# Altium footprint library Header.PcbLib: 297 footprints (part 3 of 23)
Each footprint in its own frame and in the unit in brackets; x right, y up, seen from the top. Pads: shape width x height; smd on the part's side, far side on the other; paste and mask are expansions set on the pad; w line width, h text height; cw(c..) or ccw(c..) is an arc to the next point about the centre after c.
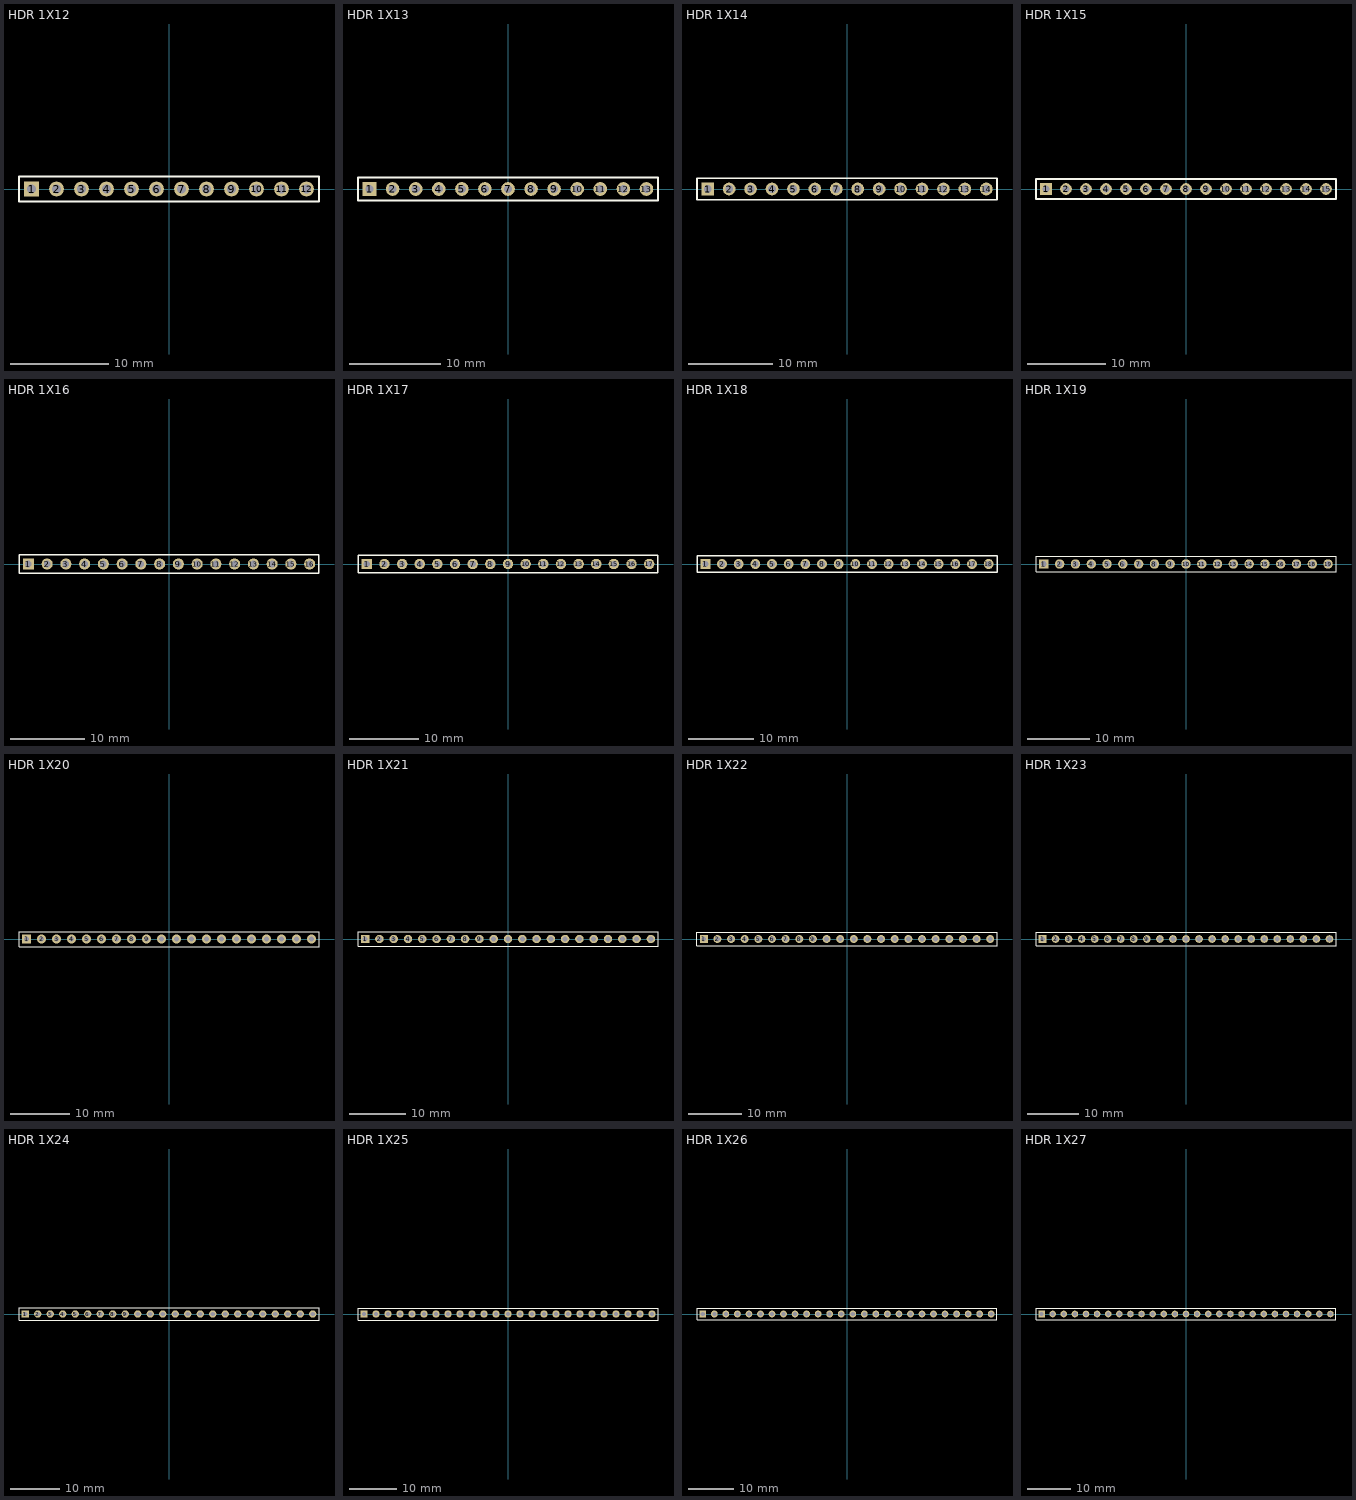
[diagram p2: the footprints below, top view; thin cyan lines are the x and y axes]

## HDR 1X12 [mm] "Connector; Header; 12 Position"
height 1.75
pads (12):
  rect 1.5x1.5 hole 0.9: 1(-13.97,0)
  round 1.5 hole 0.9: 2(-11.43,0) 3(-8.89,0) 4(-6.35,0) 5(-3.81,0) 6(-1.27,0) 7(1.27,0) 8(3.81,0) 9(6.35,0) 10(8.89,0) 11(11.43,0) 12(13.97,0)
Top Overlay:
  lines w0.2: -15.24,-1.27 15.24,-1.27 15.24,1.27 -15.24,1.27 -15.24,-1.27
3D body "header 12.STEP": height 8.51, standoff -3.68, extent -15.23,-1.27 15.24,1.26

## HDR 1X13 [mm] "Connector; Header; 13 Position"
height 1.75
pads (13):
  rect 1.5x1.5 hole 0.9: 1(-15.24,0)
  round 1.5 hole 0.9: 2(-12.7,0) 3(-10.16,0) 4(-7.62,0) 5(-5.08,0) 6(-2.54,0) 7(0,0) 8(2.54,0) 9(5.08,0) 10(7.62,0) 11(10.16,0) 12(12.7,0) 13(15.24,0)
Top Overlay:
  lines w0.2: -16.51,-1.27 16.51,-1.27 16.51,1.27 -16.51,1.27 -16.51,-1.27
3D body "header 13.STEP": height 8.51, standoff -3.68, extent -16.5,-1.27 16.51,1.26

## HDR 1X14 [mm] "Connector; Header; 14 Position"
height 1.75
pads (14):
  rect 1.5x1.5 hole 0.9: 1(-16.51,0)
  round 1.5 hole 0.9: 2(-13.97,0) 3(-11.43,0) 4(-8.89,0) 5(-6.35,0) 6(-3.81,0) 7(-1.27,0) 8(1.27,0) 9(3.81,0) 10(6.35,0) 11(8.89,0) 12(11.43,0) 13(13.97,0) 14(16.51,0)
Top Overlay:
  lines w0.2: -17.78,-1.27 17.78,-1.27 17.78,1.27 -17.78,1.27 -17.78,-1.27
3D body "header 14.STEP": height 8.51, standoff -3.68, extent -17.77,-1.27 17.78,1.26

## HDR 1X15 [mm] "Connector; Header; 15 Position"
height 1.75
pads (15):
  rect 1.5x1.5 hole 0.9: 1(-17.78,0)
  round 1.5 hole 0.9: 2(-15.24,0) 3(-12.7,0) 4(-10.16,0) 5(-7.62,0) 6(-5.08,0) 7(-2.54,0) 8(0,0) 9(2.54,0) 10(5.08,0) 11(7.62,0) 12(10.16,0) 13(12.7,0) 14(15.24,0) 15(17.78,0)
Top Overlay:
  lines w0.2: -19.05,-1.27 -19.05,1.27 19.05,1.27 19.05,-1.27 -19.05,-1.27
3D body "header 15.STEP": height 8.51, standoff -3.68, extent -19.04,-1.27 19.05,1.26

## HDR 1X16 [mm] "Connector; Header; 16 Position"
height 1.75
pads (16):
  rect 1.5x1.5 hole 0.9: 1(-19.05,0)
  round 1.5 hole 0.9: 2(-16.51,0) 3(-13.97,0) 4(-11.43,0) 5(-8.89,0) 6(-6.35,0) 7(-3.81,0) 8(-1.27,0) 9(1.27,0) 10(3.81,0) 11(6.35,0) 12(8.89,0) 13(11.43,0) 14(13.97,0) 15(16.51,0) 16(19.05,0)
Top Overlay:
  lines w0.2: -20.32,-1.27 -20.32,1.27 20.32,1.27 20.32,-1.27 -20.32,-1.27
3D body "header 16.STEP": height 8.51, standoff -3.68, extent -20.31,-1.27 20.32,1.26

## HDR 1X17 [mm] "Connector; Header; 17 Position"
height 1.75
pads (17):
  rect 1.5x1.5 hole 0.9: 1(-20.32,0)
  round 1.5 hole 0.9: 2(-17.78,0) 3(-15.24,0) 4(-12.7,0) 5(-10.16,0) 6(-7.62,0) 7(-5.08,0) 8(-2.54,0) 9(0,0) 10(2.54,0) 11(5.08,0) 12(7.62,0) 13(10.16,0) 14(12.7,0) 15(15.24,0) 16(17.78,0) 17(20.32,0)
Top Overlay:
  lines w0.2: -21.59,-1.27 -21.59,1.27 21.59,1.27 21.59,-1.27 -21.59,-1.27
3D body "header 17.STEP": height 8.51, standoff -3.68, extent -21.58,-1.27 21.59,1.26

## HDR 1X18 [mm] "Connector; Header; 18 Position"
height 1.75
pads (18):
  rect 1.5x1.5 hole 0.9: 1(-21.59,0)
  round 1.5 hole 0.9: 2(-19.05,0) 3(-16.51,0) 4(-13.97,0) 5(-11.43,0) 6(-8.89,0) 7(-6.35,0) 8(-3.81,0) 9(-1.27,0) 10(1.27,0) 11(3.81,0) 12(6.35,0) 13(8.89,0) 14(11.43,0) 15(13.97,0) 16(16.51,0) 17(19.05,0) 18(21.59,0)
Top Overlay:
  lines w0.2: -22.86,-1.27 -22.86,1.27 22.86,1.27 22.86,-1.27 -22.86,-1.27
3D body "header 18.STEP": height 8.51, standoff -3.68, extent -22.85,-1.27 22.86,1.26

## HDR 1X19 [mm] "Connector; Header; 19 Position"
height 1.75
pads (19):
  rect 1.5x1.5 hole 0.9: 1(-22.86,0)
  round 1.5 hole 0.9: 2(-20.32,0) 3(-17.78,0) 4(-15.24,0) 5(-12.7,0) 6(-10.16,0) 7(-7.62,0) 8(-5.08,0) 9(-2.54,0) 10(0,0) 11(2.54,0) 12(5.08,0) 13(7.62,0) 14(10.16,0) 15(12.7,0) 16(15.24,0) 17(17.78,0) 18(20.32,0) 19(22.86,0)
Top Overlay:
  lines w0.2: -24.13,-1.27 -24.13,1.27 24.13,1.27 24.13,-1.27 -24.13,-1.27
3D body "header 19.STEP": height 8.51, standoff -3.68, extent -24.12,-1.27 24.13,1.26

## HDR 1X20 [mm] "Connector; Header; 20 Position"
height 1.75
pads (20):
  rect 1.5x1.5 hole 0.9: 1(-24.13,0)
  round 1.5 hole 0.9: 2(-21.59,0) 3(-19.05,0) 4(-16.51,0) 5(-13.97,0) 6(-11.43,0) 7(-8.89,0) 8(-6.35,0) 9(-3.81,0) 10(-1.27,0) 11(1.27,0) 12(3.81,0) 13(6.35,0) 14(8.89,0) 15(11.43,0) 16(13.97,0) 17(16.51,0) 18(19.05,0) 19(21.59,0) 20(24.13,0)
Top Overlay:
  lines w0.2: -25.4,-1.27 25.4,-1.27 25.4,1.27 -25.4,1.27 -25.4,-1.27
3D body "header 20.STEP": height 8.51, standoff -3.68, extent -25.39,-1.27 25.4,1.26

## HDR 1X21 [mm] "Connector; Header; 21 Position"
height 1.75
pads (21):
  rect 1.5x1.5 hole 0.9: 1(-25.4,0)
  round 1.5 hole 0.9: 2(-22.86,0) 3(-20.32,0) 4(-17.78,0) 5(-15.24,0) 6(-12.7,0) 7(-10.16,0) 8(-7.62,0) 9(-5.08,0) 10(-2.54,0) 11(0,0) 12(2.54,0) 13(5.08,0) 14(7.62,0) 15(10.16,0) 16(12.7,0) 17(15.24,0) 18(17.78,0) 19(20.32,0) 20(22.86,0) 21(25.4,0)
Top Overlay:
  lines w0.2: -26.67,-1.27 -26.67,1.27 26.67,1.27 26.67,-1.27 -26.67,-1.27
3D body "header 21.STEP": height 8.51, standoff -3.68, extent -26.66,-1.27 26.67,1.26

## HDR 1X22 [mm] "Connector; Header; 22 Position"
height 1.75
pads (22):
  rect 1.5x1.5 hole 0.9: 1(-26.67,0)
  round 1.5 hole 0.9: 2(-24.13,0) 3(-21.59,0) 4(-19.05,0) 5(-16.51,0) 6(-13.97,0) 7(-11.43,0) 8(-8.89,0) 9(-6.35,0) 10(-3.81,0) 11(-1.27,0) 12(1.27,0) 13(3.81,0) 14(6.35,0) 15(8.89,0) 16(11.43,0) 17(13.97,0) 18(16.51,0) 19(19.05,0) 20(21.59,0) 21(24.13,0) 22(26.67,0)
Top Overlay:
  lines w0.2: -27.94,-1.27 -27.94,1.27 27.94,1.27 27.94,-1.27 -27.94,-1.27
3D body "header 22.STEP": height 8.51, standoff -3.68, extent -27.93,-1.27 27.94,1.26

## HDR 1X23 [mm] "Connector; Header; 23 Position"
height 1.75
pads (23):
  rect 1.5x1.5 hole 0.9: 1(-27.94,0)
  round 1.5 hole 0.9: 2(-25.4,0) 3(-22.86,0) 4(-20.32,0) 5(-17.78,0) 6(-15.24,0) 7(-12.7,0) 8(-10.16,0) 9(-7.62,0) 10(-5.08,0) 11(-2.54,0) 12(0,0) 13(2.54,0) 14(5.08,0) 15(7.62,0) 16(10.16,0) 17(12.7,0) 18(15.24,0) 19(17.78,0) 20(20.32,0) 21(22.86,0) 22(25.4,0) 23(27.94,0)
Top Overlay:
  lines w0.2: -29.21,-1.27 29.21,-1.27 29.21,1.27 -29.21,1.27 -29.21,-1.27
3D body "header 23.STEP": height 8.51, standoff -3.68, extent -29.2,-1.27 29.21,1.26

## HDR 1X24 [mm] "Connector; Header; 24 Position"
height 1.75
pads (24):
  rect 1.5x1.5 hole 0.9: 1(-29.21,0)
  round 1.5 hole 0.9: 2(-26.67,0) 3(-24.13,0) 4(-21.59,0) 5(-19.05,0) 6(-16.51,0) 7(-13.97,0) 8(-11.43,0) 9(-8.89,0) 10(-6.35,0) 11(-3.81,0) 12(-1.27,0) 13(1.27,0) 14(3.81,0) 15(6.35,0) 16(8.89,0) 17(11.43,0) 18(13.97,0) 19(16.51,0) 20(19.05,0) 21(21.59,0) 22(24.13,0) 23(26.67,0) 24(29.21,0)
Top Overlay:
  lines w0.2: -30.48,-1.27 -30.48,1.27 30.48,1.27 30.48,-1.27 -30.48,-1.27
3D body "header 24.STEP": height 8.51, standoff -3.68, extent -30.47,-1.27 30.48,1.26

## HDR 1X25 [mm] "Connector; Header; 25 Position"
height 1.75
pads (25):
  rect 1.5x1.5 hole 0.9: 1(-30.48,0)
  round 1.5 hole 0.9: 2(-27.94,0) 3(-25.4,0) 4(-22.86,0) 5(-20.32,0) 6(-17.78,0) 7(-15.24,0) 8(-12.7,0) 9(-10.16,0) 10(-7.62,0) 11(-5.08,0) 12(-2.54,0) 13(0,0) 14(2.54,0) 15(5.08,0) 16(7.62,0) 17(10.16,0) 18(12.7,0) 19(15.24,0) 20(17.78,0) 21(20.32,0) 22(22.86,0) 23(25.4,0) 24(27.94,0) 25(30.48,0)
Top Overlay:
  lines w0.2: -31.75,-1.27 -31.75,1.27 31.75,1.27 31.75,-1.27 -31.75,-1.27
3D body "header 25.STEP": height 8.51, standoff -3.68, extent -31.74,-1.27 31.75,1.26

## HDR 1X26 [mm] "Connector; Header; 26 Position"
height 1.75
pads (26):
  rect 1.5x1.5 hole 0.9: 1(-31.75,0)
  round 1.5 hole 0.9: 2(-29.21,0) 3(-26.67,0) 4(-24.13,0) 5(-21.59,0) 6(-19.05,0) 7(-16.51,0) 8(-13.97,0) 9(-11.43,0) 10(-8.89,0) 11(-6.35,0) 12(-3.81,0) 13(-1.27,0) 14(1.27,0) 15(3.81,0) 16(6.35,0) 17(8.89,0) 18(11.43,0) 19(13.97,0) 20(16.51,0) 21(19.05,0) 22(21.59,0) 23(24.13,0) 24(26.67,0) 25(29.21,0) 26(31.75,0)
Top Overlay:
  lines w0.2: -33.02,-1.27 -33.02,1.27 33.02,1.27 33.02,-1.27 -33.02,-1.27
3D body "header 26.STEP": height 8.51, standoff -3.68, extent -33.01,-1.27 33.02,1.26

## HDR 1X27 [mm] "Connector; Header; 27 Position"
height 1.75
pads (27):
  rect 1.5x1.5 hole 0.9: 1(-33.02,0)
  round 1.5 hole 0.9: 2(-30.48,0) 3(-27.94,0) 4(-25.4,0) 5(-22.86,0) 6(-20.32,0) 7(-17.78,0) 8(-15.24,0) 9(-12.7,0) 10(-10.16,0) 11(-7.62,0) 12(-5.08,0) 13(-2.54,0) 14(0,0) 15(2.54,0) 16(5.08,0) 17(7.62,0) 18(10.16,0) 19(12.7,0) 20(15.24,0) 21(17.78,0) 22(20.32,0) 23(22.86,0) 24(25.4,0) 25(27.94,0) 26(30.48,0) 27(33.02,0)
Top Overlay:
  lines w0.2: -34.29,-1.27 34.29,-1.27 34.29,1.27 -34.29,1.27 -34.29,-1.27
3D body "header 27.STEP": height 8.51, standoff -3.68, extent -34.28,-1.27 34.29,1.26